# Altium footprint library PCB.PcbLib: 50 footprints (part 2 of 4)
Each footprint in its own frame and in the unit in brackets; x right, y up, seen from the top. Pads: shape width x height; smd on the part's side, far side on the other; paste and mask are expansions set on the pad; w line width, h text height; cw(c..) or ccw(c..) is an arc to the next point about the centre after c.
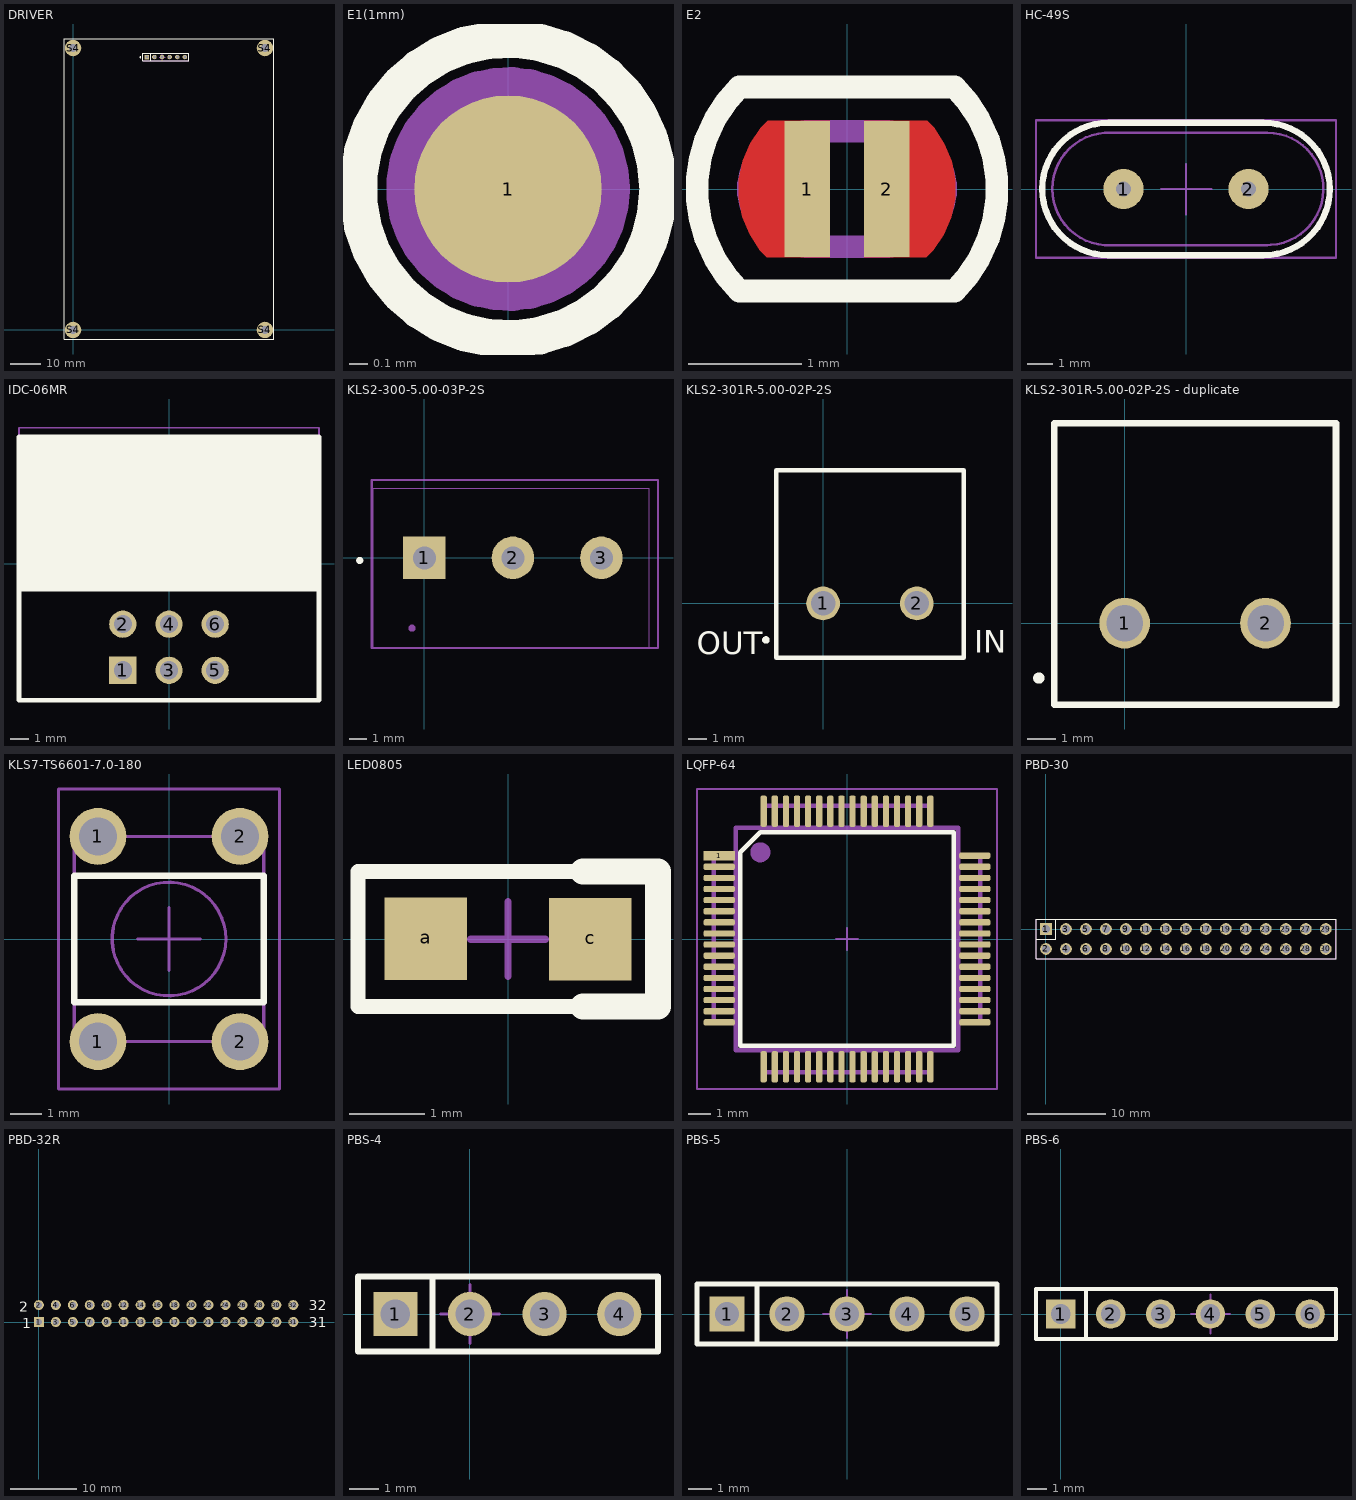
[diagram p1: the footprints below, top view; thin cyan lines are the x and y axes]

## DRIVER [mm]
height 8.5
pads (10):
  rect 1.5x1.5 hole 1: 1(24.6,91)
  round 1.5 hole 1: 2(27.14,91) 3(29.68,91) 4(32.22,91) 5(34.76,91) 6(37.3,91)
  round 5.5 hole 2.75: S4(0,0) S4(0,94) S4(64,0) S4(64,94)
Top Overlay:
  circle w0.25: c22.45,90.925 r0.125
  lines w0.2: -3,-3 -3,97 ; 25.905,89.73 25.905,92.27 ; 67,-3 67,97 ; 38.57,89.73 38.57,92.27 ; 38.57,89.73 23.28,89.73 23.28,92.27 38.57,92.27 ; 38.57,89.73 38.57,92.27
  lines w0.24: -3,-3 67,-3 ; -3,33.15 -3,48.55 ; -3,97 67,97 ; 23.3,97 38.7,97 ; 25.3,-3 40.7,-3 ; 67,45.45 67,60.85
Mechanical 13:
  lines w0.1: 25.87,89.73 25.87,92.27 ; 38.57,89.73 38.57,92.27 ; 38.57,89.73 23.28,89.73 23.28,92.27 38.57,92.27 ; 38.57,89.73 38.57,92.27
Mechanical 15:
  lines w0.1: 28.68,91 30.68,91 ; 29.68,90 29.68,92 ; 38.57,89.73 38.57,92.27 ; 38.57,89.73 23.28,89.73 23.28,92.27 38.57,92.27 ; 38.57,89.73 38.57,92.27
3D body "PBS-1.stp": height 8.6, standoff -3.05, extent 23.335,89.705 25.875,92.245
3D body "PBS-1.stp": height 8.6, standoff -3.05, extent 25.875,89.705 28.415,92.245
3D body "PBS-1.stp": height 8.6, standoff -3.05, extent 36.035,89.705 38.575,92.245
3D body "PBS-1.stp": height 8.6, standoff -3.05, extent 33.495,89.705 36.035,92.245
3D body "PBS-1.stp": height 8.6, standoff -3.05, extent 30.955,89.705 33.495,92.245
3D body "PBS-1.stp": height 8.6, standoff -3.05, extent 28.415,89.705 30.955,92.245

## E1(1mm) [mm]
pads (1):
  round 1 smd: 1(0,0)
Top Overlay:
  circle w0.2: c0,0 r0.8
Top Assembly:
  circle w0.3: c0,0 r0.5
  text "'.Designator'" at -1.4,1 h2.4

## E2 [mm] "Перемычка"
pads (2):
  rect 0.4x1.2 smd mask+0.1: 1(-0.35,0) 2(0.35,0)
Top Layer:
  region: 0.15,-0.6 0.7,-0.6 0.76,-0.541 0.853,-0.403 0.919,-0.249 0.952,-0.085 0.954,0.082 0.922,0.246 0.86,0.401 0.768,0.54 0.709,0.6 0.7,0.6 0.15,0.6
  region: -0.15,0.6 -0.7,0.6 -0.76,0.541 -0.853,0.403 -0.919,0.249 -0.952,0.085 -0.954,-0.082 -0.922,-0.246 -0.86,-0.401 -0.768,-0.54 -0.709,-0.6 -0.7,-0.6 -0.15,-0.6
Top Overlay:
  lines w0.2: -0.95,-0.9 cw(c-0.05,0) -0.95,0.9 0.95,0.9 cw(c0.05,0) 0.95,-0.9 -0.95,-0.9
Top Solder:
  rectangle: -0.4,-0.7 0.5,0.7
Top Assembly:
  lines w0.2: -0.362,-0.508 cw(c-0.362,0) -0.362,0.508 0.362,0.508 cw(c0.362,0) 0.362,-0.508 -0.362,-0.508
  text ".Designator" at -1.35,1 h2.5

## HC-49S [mm] "HC49 Short Through-hole Mount Footprint"
height 5
pads (2):
  round 1.6 hole 0.6: 1(-2.5,0) 2(2.5,0)
Top Overlay:
  lines w0.25: -3.125,-2.65 3.1,-2.65 ccw(c3.1,0) 3.1,2.65 -3.1,2.65 ccw(c-3.1,0) -3.1,-2.65
Mechanical 13:
  lines w0.1: -3.25,-2.25 3.25,-2.25 ; -3.25,-2.245 cw(c-3.1,0) -3.25,2.245 ; -3.25,2.25 3.25,2.25 cw(c3.25,0.005) 3.399,-2.235 3.25,-2.245
Mechanical 15:
  lines w0.1: -1,0 1,0 ; 0,-1 0,1 ; -6,-2.75 -6,2.75 6,2.75 6,-2.75 -6,-2.75
3D body "User Library-HP49US.step": height 5, standoff -2.5, extent -5.675,-2.3 5.675,2.35

## IDC-06MR [mm]
height 8.7
pads (6):
  rect 1.5x1.5 hole 1: 1(-2.54,-5.85)
  round 1.5 hole 1: 2(-2.54,-3.31) 3(0,-5.85) 4(0,-3.31) 5(2.54,-5.85) 6(2.54,-3.31)
Top Overlay:
  rectangle: -8.255,-1.5 8.255,7
  lines w0.25: -8.255,-7.5 -8.255,7 8.255,7 8.255,-7.5 -8.255,-7.5
Mechanical 15:
  lines w0.1: -1,0 1,0 ; 0,-1 0,1 ; -8.255,-7.5 -8.255,7.5 8.255,7.5 8.255,-7.5 -8.255,-7.5
3D body "User Library-IDC Socket Male 6pin Angled THT Goldplated 2_54mm.step": height 8.98, standoff -2.37, extent -7.93,-6.35 7.93,7.21

## KLS2-300-5.00-03P-2S [mm]
height 12.6
pads (3):
  rect 2.4x2.4 / inner round 2.4 / far side rect 2.4x2.4 hole 1.3: 1(0,0)
  round 2.4 hole 1.3: 2(5,0) 3(10,0)
Top Overlay:
  circle w0.2: c-3.65,-0.15 r0.1
Mechanical 13:
  circle w0.2: c-0.7,-3.975 r0.1
  lines w0.127: -2.975,4.35 -2.975,-5.1 13.2,-5.1 13.2,4.35 ; -2.975,4.4 13.2,4.4
Mechanical 15:
  lines w0.05: -2.9,-5.075 12.7,-5.075 12.7,3.925 -2.9,3.925 -2.9,-5.075
3D body "DG300-5.0-03p-12.stp": height 12.6, standoff -3, extent -2.6,-4.8 13,4.2

## KLS2-301R-5.00-02P-2S [mm]
height 7.6
pads (2):
  round 1.8 hole 1.3: 1(0,0) 2(5,0)
Top Overlay:
  circle w0.2: c-3.05,-1.95 r0.1
  lines w0.24: -2.5,-2.9 7.5,-2.9 7.5,7.1 -2.5,7.1 -2.5,-2.9
  text "OUT" at -6.725,-2.725 h1.2
  text "IN" at 8.075,-2.625 h1.2
3D body: height 7.7, standoff 0.3, extent -2.62,-3.02 7.62,7.22

## KLS2-301R-5.00-02P-2S - duplicate [mm]
height 7.6
pads (2):
  round 1.8 hole 1.3: 1(0,0) 2(5,0)
Top Overlay:
  circle w0.2: c-3.05,-1.95 r0.1
  lines w0.24: -2.5,-2.9 -2.5,7.1 7.5,7.1 7.5,-2.9 -2.5,-2.9
3D body: height 7.7, standoff 0.3, extent -2.62,-3.02 7.62,7.22

## KLS7-TS6601-7.0-180 [mm]
pads (4):
  round 1.8 hole 1.2: 1(-2.25,-3.25) 1(-2.25,3.25) 2(2.25,-3.25) 2(2.25,3.25)
Top Overlay:
  lines w0.2: -3,-2 -3,2 3,2 3,-2 -3,-2
Mechanical 13:
  circle w0.1: c0,0 r1.8
  lines w0.1: -3,-3.25 -3,3.25 3,3.25 3,-3.25 -3,-3.25
Mechanical 15:
  lines w0.1: -1,0 1,0 ; 0,-1 0,1 ; -3.5,-4.75 3.5,-4.75 3.5,4.75 -3.5,4.75 -3.5,-4.75
3D body "PTS645T50.STEP": height 7, standoff -1.5, extent -3,-3.75 3,3.749

## LED0805 [mm]
height 2
pads (2):
  rect 1.1x1.1 smd: a(-1.1,0) c(1.1,0)
Top Overlay:
  lines w0.2: 1,-0.9 -2,-0.9 -2,0.9 1,0.9
  lines w0.35: 1,-0.9 2,-0.9 2,0.9 1,0.9
Top Assembly:
  lines w0.05: -2,-0.9 2,-0.9 2,0.9 -2,0.9 -2,-0.9
  text ".Designator" at -1.75,-0.5 h1.5
Mechanical 15:
  lines w0.1: -0.5,0 0.5,0 ; 0,-0.5 0,0.5 ; -2,-0.9 2,-0.9 2,0.9 -2,0.9 -2,-0.9
3D body "LED_2012_075.STEP": height 0.73, standoff -0.02, extent -1,-0.625 1,0.625

## LQFP-64 [mm] "Thin QFP, 64-Leads, Body 10x10mm, Pitch 0.5mm, IPC Medium Density"
height 1.6
pads (64):
  rect 1.4x0.42 smd mask+0.2: 1(-5.75,3.75)
  rrect50% 1.4x0.28 smd mask+0.2: 2(-5.75,3.25) 3(-5.75,2.75) 4(-5.75,2.25) 5(-5.75,1.75) 6(-5.75,1.25) 7(-5.75,0.75) 8(-5.75,0.25) 9(-5.75,-0.25) 10(-5.75,-0.75) 11(-5.75,-1.25) 12(-5.75,-1.75) 13(-5.75,-2.25) 14(-5.75,-2.75) 15(-5.75,-3.25) 16(-5.75,-3.75) 33(5.75,-3.75) 34(5.75,-3.25) 35(5.75,-2.75) 36(5.75,-2.25) 37(5.75,-1.75) 38(5.75,-1.25) 39(5.75,-0.75) 40(5.75,-0.25) 41(5.75,0.25) 42(5.75,0.75) 43(5.75,1.25) 44(5.75,1.75) 45(5.75,2.25) 46(5.75,2.75) 47(5.75,3.25) 48(5.75,3.75)
  rrect50% 0.28x1.4 smd mask+0.2: 17(-3.75,-5.75) 18(-3.25,-5.75) 19(-2.75,-5.75) 20(-2.25,-5.75) 21(-1.75,-5.75) 22(-1.25,-5.75) 23(-0.75,-5.75) 24(-0.25,-5.75) 25(0.25,-5.75) 26(0.75,-5.75) 27(1.25,-5.75) 28(1.75,-5.75) 29(2.25,-5.75) 30(2.75,-5.75) 31(3.25,-5.75) 32(3.75,-5.75) 49(3.75,5.75) 50(3.25,5.75) 51(2.75,5.75) 52(2.25,5.75) 53(1.75,5.75) 54(1.25,5.75) 55(0.75,5.75) 56(0.25,5.75) 57(-0.25,5.75) 58(-0.75,5.75) 59(-1.25,5.75) 60(-1.75,5.75) 61(-2.25,5.75) 62(-2.75,5.75) 63(-3.25,5.75) 64(-3.75,5.75)
Top Overlay:
  lines w0.2: -4.8,-4.8 4.8,-4.8 4.8,4.8 -3.9,4.8 -4.8,3.9 -4.8,-4.8
Top Component Outline:
  lines w0.1: -0.5,0 0.5,0 ; 0,-0.5 0,0.5 ; -6.75,-6.75 -6.75,6.75 6.75,6.75 6.75,-6.75 -6.75,-6.75
Top Assembly:
  circle w0.5: c-3.9,3.9 r0.2
  lines w0.2: -5,-3.75 -6,-3.75 -6,3.75 -5,3.75 ; -3.75,-5 -3.75,-6 3.75,-6 3.75,-5 ; -3.75,5 -3.75,6 3.75,6 3.75,5 ; 5,-3.75 6,-3.75 6,3.75 5,3.75 ; -5,-5 -5,5 5,5 5,-5 -5,-5
  text ".Designator" at -4.1,-0.6 h2.4
3D body "User Library-LQFP64_Grid_0_5.STEP": height 1.6, standoff 0, extent -6,-6 6,6

## PBD-30 [mm]
height 15
pads (30):
  rect 1.5x1.5 hole 1: 1(0,0)
  round 1.5 hole 1: 2(0,-2.54) 3(2.54,0) 4(2.54,-2.54) 5(5.08,0) 6(5.08,-2.54) 7(7.62,0) 8(7.62,-2.54) 9(10.16,0) 10(10.16,-2.54) 11(12.7,0) 12(12.7,-2.54) 13(15.24,0) 14(15.24,-2.54) 15(17.78,0) 16(17.78,-2.54) 17(20.32,0) 18(20.32,-2.54) 19(22.86,0) 20(22.86,-2.54) 21(25.4,0) 22(25.4,-2.54) 23(27.94,0) 24(27.94,-2.54) 25(30.48,0) 26(30.48,-2.54) 27(33.02,0) 28(33.02,-2.54) 29(35.56,0) 30(35.56,-2.54)
Top Overlay:
  lines w0.125: -1.27,-1.27 1.27,-1.27 1.27,1.27 ; 3.81,-3.81 36.855,-3.81 36.855,1.27 3.81,1.27 ; 6.35,-3.81 -1.27,-3.81 -1.27,1.27 6.35,1.27
Mechanical 13:
  lines w0.1: -1.27,-1.27 1.27,-1.27 1.27,1.27 ; 3.81,-3.81 36.83,-3.81 36.83,1.27 3.81,1.27 ; 6.35,-3.81 -1.27,-3.81 -1.27,1.27 6.35,1.27
Mechanical 15:
  lines w0.1: 3.81,-3.81 36.83,-3.81 36.83,1.27 3.81,1.27 ; 6.35,-3.81 -1.27,-3.81 -1.27,1.27 6.35,1.27
3D body "PBD-2.stp": height 8.7, standoff -2.95, extent 34.29,-3.81 36.83,1.27
3D body "PBD-2.stp": height 8.7, standoff -2.95, extent 26.67,-3.81 29.21,1.27
3D body "PBD-2.stp": height 8.7, standoff -2.95, extent 31.75,-3.81 34.29,1.27
3D body "PBD-2.stp": height 8.7, standoff -2.95, extent 29.21,-3.81 31.75,1.27
3D body "PBD-2.stp": height 8.7, standoff -2.95, extent 19.05,-3.81 21.59,1.27
3D body "PBD-2.stp": height 8.7, standoff -2.95, extent 24.13,-3.81 26.67,1.27
3D body "PBD-2.stp": height 8.7, standoff -2.95, extent 21.59,-3.81 24.13,1.27
3D body "PBD-2.stp": height 8.7, standoff -2.95, extent 11.43,-3.81 13.97,1.27
3D body "PBD-2.stp": height 8.7, standoff -2.95, extent 16.51,-3.81 19.05,1.27
3D body "PBD-2.stp": height 8.7, standoff -2.95, extent 13.97,-3.81 16.51,1.27
3D body "PBD-2.stp": height 8.7, standoff -2.95, extent 6.35,-3.81 8.89,1.27
3D body "PBD-2.stp": height 8.7, standoff -2.95, extent 8.89,-3.81 11.43,1.27
3D body "PBD-2.stp": height 8.7, standoff -2.95, extent 3.81,-3.81 6.35,1.27
3D body "PBD-2.stp": height 8.7, standoff -2.95, extent -1.27,-3.81 1.27,1.27
3D body "PBD-2.stp": height 8.7, standoff -2.95, extent 1.27,-3.81 3.81,1.27

## PBD-32R [mm] "Connector; Header; 3x2 Position"
height 5
pads (32):
  rect 1.5x1.5 hole 0.9: 1(0,0)
  round 1.5 hole 0.9: 2(0,2.54) 3(2.54,0) 4(2.54,2.54) 5(5.08,0) 6(5.08,2.54) 7(7.62,0) 8(7.62,2.54) 9(10.16,0) 10(10.16,2.54) 11(12.7,0) 12(12.7,2.54) 13(15.24,0) 14(15.24,2.54) 15(17.78,0) 16(17.78,2.54) 17(20.32,0) 18(20.32,2.54) 19(22.86,0) 20(22.86,2.54) 21(25.4,0) 22(25.4,2.54) 23(27.94,0) 24(27.94,2.54) 25(30.48,0) 26(30.48,2.54) 27(33.02,0) 28(33.02,2.54) 29(35.56,0) 30(35.56,2.54) 31(38.1,0) 32(38.1,2.54)
Top Overlay:
  text "1" at -2.525,-0.9 h1.52
  text "2" at -2.975,1.575 h1.52
  text "31" at 40.425,-0.75 h1.52
  text "32" at 40.425,1.79 h1.52
3D body "PBD-6R.step": height 5, standoff -3, extent 29.21,-0.3 36.83,12.7
3D body "PBD-6R.step": height 5, standoff -3, extent 21.59,-0.3 29.21,12.7
3D body "PBD-6R.step": height 5, standoff -3, extent 13.97,-0.3 21.59,12.7
3D body "PBD-6R.step": height 5, standoff -3, extent 6.35,-0.3 13.97,12.7
3D body "PBD-6R.step": height 5, standoff -3, extent -1.27,-0.3 6.35,12.7
3D body "PBD-6R.step": height 5, standoff -3, extent 31.75,-0.3 39.37,12.7

## PBS-4 [mm]
height 15
pads (4):
  rect 1.5x1.5 hole 1: 1(-2.54,0)
  round 1.5 hole 1: 2(0,0) 3(2.54,0) 4(5.08,0)
Top Overlay:
  lines w0.2: -1.27,-1.27 -1.27,1.27 ; -3.81,-1.27 -3.81,1.27 6.4,1.27 6.4,-1.27 -3.81,-1.27
Mechanical 13:
  lines w0.1: -1.27,-1.27 -1.27,1.27 ; -3.81,-1.27 6.4,-1.27 6.4,1.27 -3.81,1.27 -3.81,-1.27
Mechanical 15:
  lines w0.1: -1,0 1,0 ; 0,-1 0,1 ; -3.81,-1.27 6.4,-1.27 6.4,1.27 -3.81,1.27 -3.81,-1.27
3D body "PBS-1.stp": height 8.6, standoff -3.05, extent 3.81,-1.27 6.35,1.27
3D body "PBS-1.stp": height 8.6, standoff -3.05, extent -3.81,-1.27 -1.27,1.27
3D body "PBS-1.stp": height 8.6, standoff -3.05, extent -1.27,-1.27 1.27,1.27
3D body "PBS-1.stp": height 8.6, standoff -3.05, extent 1.27,-1.27 3.81,1.27

## PBS-5 [mm]
height 15
pads (5):
  rect 1.5x1.5 hole 1: 1(-5.08,0)
  round 1.5 hole 1: 2(-2.54,0) 3(0,0) 4(2.54,0) 5(5.08,0)
Top Overlay:
  lines w0.2: -3.81,-1.27 -3.81,1.27 ; -6.35,-1.27 -6.35,1.27 6.35,1.27 6.35,-1.27 -6.35,-1.27
Mechanical 13:
  lines w0.1: -3.81,-1.27 -3.81,1.27 ; -6.35,-1.27 -6.35,1.27 6.35,1.27 6.35,-1.27 -6.35,-1.27
Mechanical 15:
  lines w0.1: -1,0 1,0 ; 0,-1 0,1 ; -6.35,-1.27 6.35,-1.27 6.35,1.27 -6.35,1.27 -6.35,-1.27
3D body "PBS-5.STEP": height 8.5, standoff -3.15, extent -6.35,-1.29 6.35,1.25

## PBS-6 [mm]
height 8.5
pads (6):
  rect 1.5x1.5 hole 1: 1(0,0)
  round 1.5 hole 1: 2(2.54,0) 3(5.08,0) 4(7.62,0) 5(10.16,0) 6(12.7,0)
Top Overlay:
  lines w0.2: 1.27,-1.27 1.27,1.27 ; -1.27,-1.27 14.02,-1.27 14.02,1.27 -1.27,1.27 -1.27,-1.27
Mechanical 13:
  lines w0.1: 1.27,-1.27 1.27,1.27 ; -1.27,-1.27 14.02,-1.27 14.02,1.27 -1.27,1.27 -1.27,-1.27
Mechanical 15:
  lines w0.1: 6.62,0 8.62,0 ; 7.62,-1 7.62,1 ; -1.27,-1.27 14.02,-1.27 14.02,1.27 -1.27,1.27 -1.27,-1.27
3D body "PBS-1.stp": height 8.6, standoff -3.05, extent 11.43,-1.27 13.97,1.27
3D body "PBS-1.stp": height 8.6, standoff -3.05, extent 8.89,-1.27 11.43,1.27
3D body "PBS-1.stp": height 8.6, standoff -3.05, extent -1.27,-1.27 1.27,1.27
3D body "PBS-1.stp": height 8.6, standoff -3.05, extent 1.27,-1.27 3.81,1.27
3D body "PBS-1.stp": height 8.6, standoff -3.05, extent 3.81,-1.27 6.35,1.27
3D body "PBS-1.stp": height 8.6, standoff -3.05, extent 6.35,-1.27 8.89,1.27